# Altium footprint library BASIC.PcbLib: 244 footprints (part 6 of 16)
Each footprint in its own frame and in the unit in brackets; x right, y up, seen from the top. Pads: shape width x height; smd on the part's side, far side on the other; paste and mask are expansions set on the pad; w line width, h text height; cw(c..) or ccw(c..) is an arc to the next point about the centre after c.
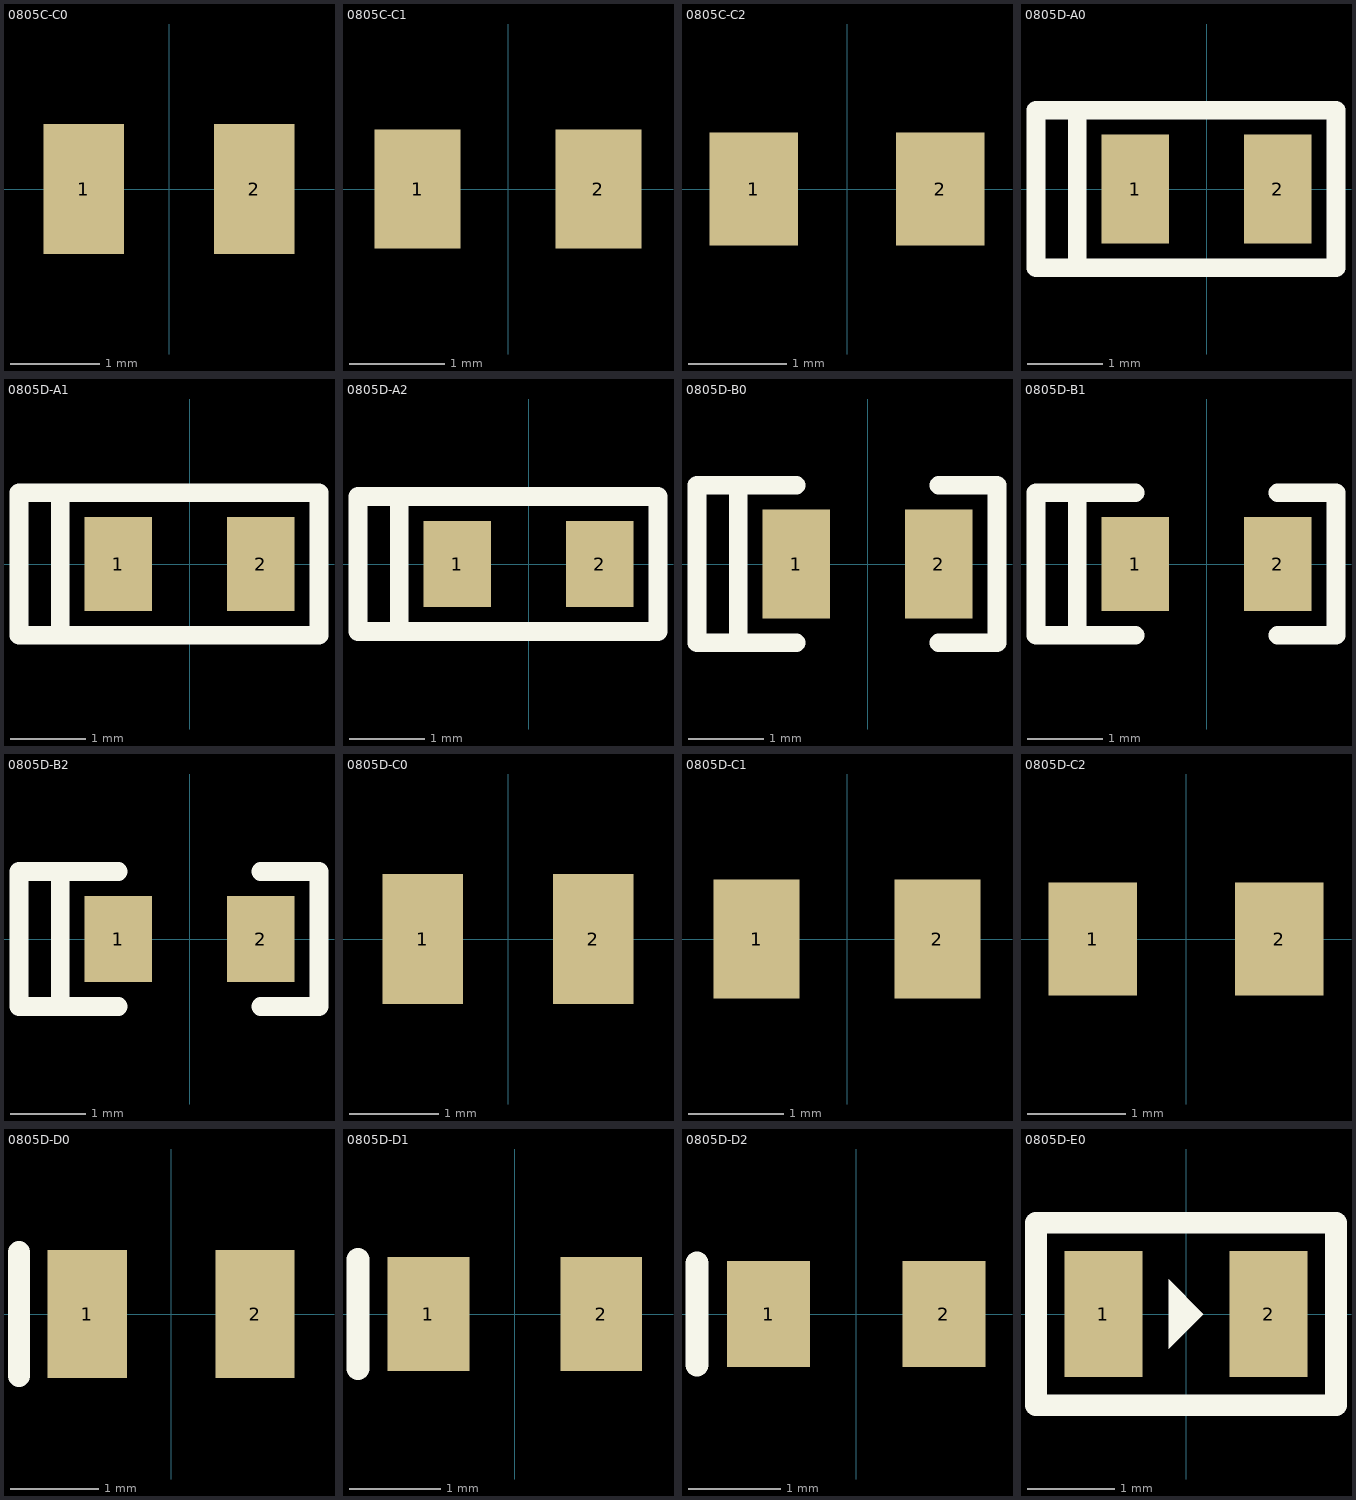
[diagram p5: the footprints below, top view; thin cyan lines are the x and y axes]

## 0805C-C0 [mm]
pads (2):
  rect 0.9x1.45 smd: 1(-0.95,0) 2(0.95,0)
3D body "RES0805.step": height 0.55, standoff 0, extent -1,-0.624 1,0.626

## 0805C-C1 [mm]
pads (2):
  rect 0.9x1.25 smd: 1(-0.95,0) 2(0.95,0)
3D body "RES0805.step": height 0.55, standoff 0, extent -1,-0.624 1,0.626

## 0805C-C2 [mm]
pads (2):
  rect 0.9x1.15 smd: 1(-0.95,0) 2(0.95,0)
3D body "RES0805.step": height 0.55, standoff 0, extent -1,-0.624 1,0.626

## 0805D-A0 [mm]
pads (2):
  rect 0.9x1.45 smd: 1(-0.95,0) 2(0.95,0)
Top Overlay:
  lines w0.25: -1.725,-1.05 1.725,-1.05 1.725,1.05 -1.725,1.05 ; -1.725,1.05 -1.725,-1.05 -2.275,-1.05 -2.275,1.05 -1.725,1.05
3D body "RES0805.step": height 0.55, standoff 0, extent -1,-0.624 1,0.626

## 0805D-A1 [mm]
pads (2):
  rect 0.9x1.25 smd: 1(-0.95,0) 2(0.95,0)
Top Overlay:
  lines w0.25: -1.725,-0.95 -2.275,-0.95 -2.275,0.95 -1.725,0.95 ; -1.725,-0.95 -1.725,0.95 ; -1.725,-0.95 1.725,-0.95 1.725,0.95 -1.725,0.95
3D body "RES0805.step": height 0.55, standoff 0, extent -1,-0.624 1,0.626

## 0805D-A2 [mm]
pads (2):
  rect 0.9x1.15 smd: 1(-0.95,0) 2(0.95,0)
Top Overlay:
  lines w0.25: -1.725,-0.9 1.725,-0.9 1.725,0.9 -1.725,0.9 ; -1.725,-0.9 -1.725,0.9 ; -1.725,-0.9 -2.275,-0.9 -2.275,0.9 -1.725,0.9
3D body "RES0805.step": height 0.55, standoff 0, extent -1,-0.624 1,0.626

## 0805D-B0 [mm]
pads (2):
  rect 0.9x1.45 smd: 1(-0.95,0) 2(0.95,0)
Top Overlay:
  lines w0.25: -1.725,-1.05 -0.95,-1.05 ; -0.95,1.05 -1.725,1.05 ; 0.95,-1.05 1.725,-1.05 ; 0.95,1.05 1.725,1.05 1.725,-1.05 ; -1.725,1.05 -1.725,-1.05 -2.275,-1.05 -2.275,1.05 -1.725,1.05
3D body "RES0805.step": height 0.55, standoff 0, extent -1,-0.624 1,0.626

## 0805D-B1 [mm]
pads (2):
  rect 0.9x1.25 smd: 1(-0.95,0) 2(0.95,0)
Top Overlay:
  lines w0.25: -0.95,-0.95 -1.725,-0.95 ; -0.95,0.95 -1.725,0.95 ; 0.95,-0.95 1.725,-0.95 1.725,0.95 0.95,0.95 ; -1.725,-0.95 -2.275,-0.95 -2.275,0.95 -1.725,0.95 ; -1.725,-0.95 -1.725,0.95
3D body "RES0805.step": height 0.55, standoff 0, extent -1,-0.624 1,0.626

## 0805D-B2 [mm]
pads (2):
  rect 0.9x1.15 smd: 1(-0.95,0) 2(0.95,0)
Top Overlay:
  lines w0.25: -0.95,-0.9 -1.725,-0.9 ; -0.95,0.9 -1.725,0.9 ; 0.95,-0.899 1.725,-0.899 1.725,0.9 0.95,0.901 ; -1.725,-0.9 -2.275,-0.9 -2.275,0.9 -1.725,0.9 ; -1.725,-0.9 -1.725,0.9
3D body "RES0805.step": height 0.55, standoff 0, extent -1,-0.624 1,0.626

## 0805D-C0 [mm]
pads (2):
  rect 0.9x1.45 smd: 1(-0.95,0) 2(0.95,0)
3D body "RES0805.step": height 0.55, standoff 0, extent -1,-0.624 1,0.626

## 0805D-C1 [mm]
pads (2):
  rect 0.9x1.25 smd: 1(-0.95,0) 2(0.95,0)
3D body "RES0805.step": height 0.55, standoff 0, extent -1,-0.624 1,0.626

## 0805D-C2 [mm]
pads (2):
  rect 0.9x1.15 smd: 1(-0.95,0) 2(0.95,0)
3D body "RES0805.step": height 0.55, standoff 0, extent -1,-0.624 1,0.626

## 0805D-D0 [mm]
pads (2):
  rect 0.9x1.45 smd: 1(-0.95,0) 2(0.95,0)
Top Overlay:
  lines w0.25: -1.725,-0.7 -1.725,0.7
3D body "RES0805.step": height 0.55, standoff 0, extent -1,-0.624 1,0.626

## 0805D-D1 [mm]
pads (2):
  rect 0.9x1.25 smd: 1(-0.95,0) 2(0.95,0)
Top Overlay:
  lines w0.25: -1.725,-0.6 -1.725,0.6
3D body "RES0805.step": height 0.55, standoff 0, extent -1,-0.624 1,0.626

## 0805D-D2 [mm]
pads (2):
  rect 0.9x1.15 smd: 1(-0.95,0) 2(0.95,0)
Top Overlay:
  lines w0.25: -1.725,-0.55 -1.725,0.55
3D body "RES0805.step": height 0.55, standoff 0, extent -1,-0.624 1,0.626

## 0805D-E0 [mm]
pads (2):
  rect 0.9x1.45 smd: 1(-0.95,0) 2(0.95,0)
Top Overlay:
  region: -0.2,0.4 -0.2,-0.4 0.2,0
  lines w0.25: -1.725,-1.05 -1.725,1.05 1.725,1.05 1.725,-1.05 -1.725,-1.05
3D body "RES0805.step": height 0.55, standoff 0, extent -1,-0.624 1,0.626